# Altium footprint library 3D_MIG_Controller.PCBLIB: 560 footprints (part 32 of 35)
Each footprint in its own frame and in the unit in brackets; x right, y up, seen from the top. Pads: shape width x height; smd on the part's side, far side on the other; paste and mask are expansions set on the pad; w line width, h text height; cw(c..) or ccw(c..) is an arc to the next point about the centre after c.
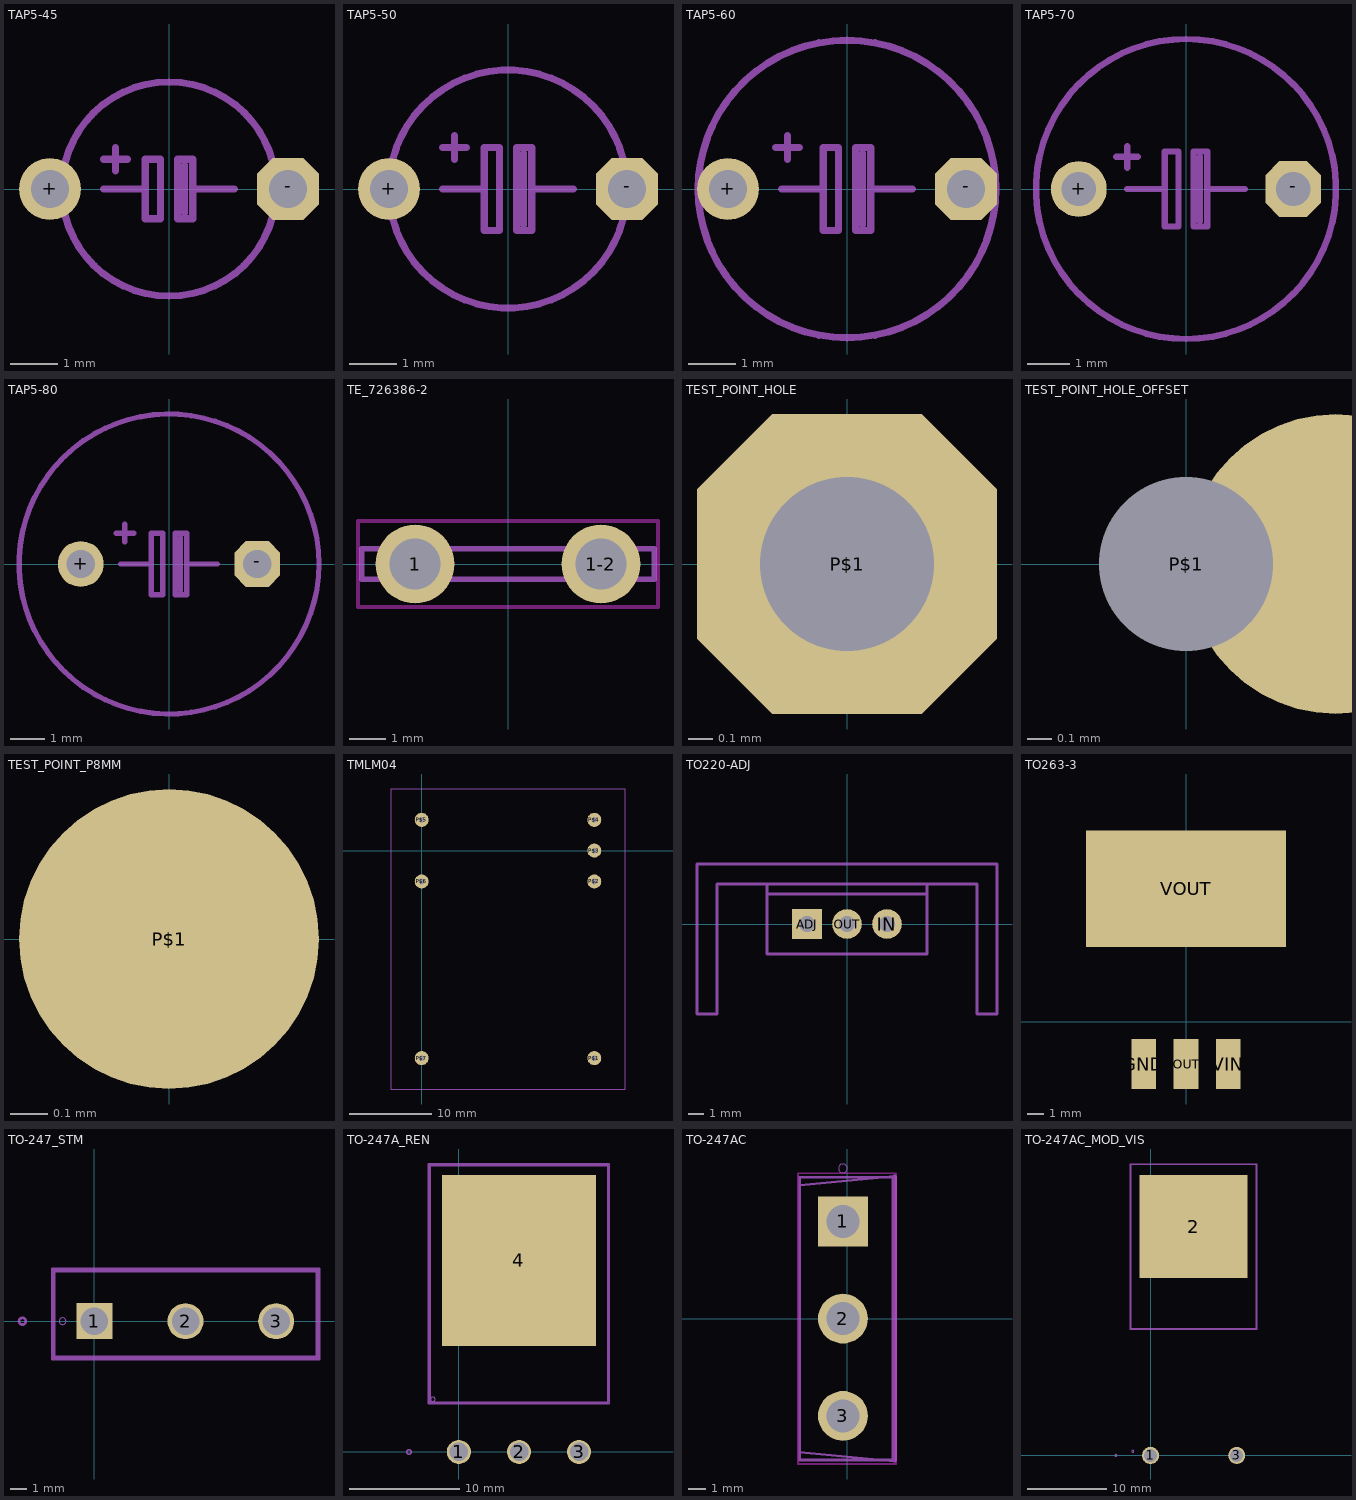
[diagram p31: the footprints below, top view; thin cyan lines are the x and y axes]

## TAP5-45 [mil]
pads (2):
  round 52 hole 32: +(-100,0)
  oct 52x52 / inner round 48.04 / far side oct 52x52 hole 32: -(100,0)
tDocu:
  lines w6: -75.37,-49.18 cw(c0,0) -75.37,49.18 ; 75.37,-49.18 ccw(c0,0) 75.37,49.18
tPlace:
  lines w6: -75.37,-49.18 ccw(c0,0) 75.37,-49.18 ; -75.37,49.18 cw(c0,0) 75.37,49.18 ; -55,0 -20,0 ; -55,25 -35,25 ; -45,15 -45,35 ; 13,-20 13,20 ; 55,0 20,0 ; -20,0 -20,-25 -7,-25 -7,25 -20,25 -20,0 ; 20,0 20,-25 7,-25 7,25 20,25 20,0
  text "TT" at -35,-75 h62

## TAP5-50 [mil]
pads (2):
  round 52 hole 32: +(-100,0)
  oct 52x52 / inner round 48.04 / far side oct 52x52 hole 32: -(100,0)
tDocu:
  lines w6: -84.87,-52.88 cw(c0,0) -84.87,52.88 ; 84.87,-52.88 ccw(c0,0) 84.87,52.88
tPlace:
  lines w6: -84.87,-52.88 ccw(c0,0) 84.87,-52.88 ; -84.87,52.88 cw(c0,0) 84.87,52.88 ; -55,0 -20,0 ; -55,35 -35,35 ; -45,25 -45,45 ; 13,-30 13,30 ; 55,0 20,0 ; -20,0 -20,-35 -7,-35 -7,35 -20,35 -20,0 ; 20,0 20,-35 7,-35 7,35 20,35 20,0
  text "TT" at -35,-85 h62

## TAP5-60 [mil]
pads (2):
  round 52 hole 32: +(-100,0)
  oct 52x52 / inner round 48.04 / far side oct 52x52 hole 32: -(100,0)
tDocu:
  lines w6: -113,-53.44 cw(c0,0) -113,53.44 ; 113,-53.44 ccw(c0,0) 113,53.44
tPlace:
  lines w6: -113,-53.44 ccw(c0,0) 113,-53.44 ; -113,53.44 cw(c0,0) 113,53.44 ; -60,35 -40,35 ; -55,0 -20,0 ; -50,25 -50,45 ; 13,-30 13,30 ; 55,0 20,0 ; -20,0 -20,-35 -7,-35 -7,35 -20,35 -20,0 ; 20,0 20,-35 7,-35 7,35 20,35 20,0
  text "TT" at 0,-100 h62

## TAP5-70 [mil]
pads (2):
  round 52 hole 32: +(-100,0)
  oct 52x52 / inner round 48.04 / far side oct 52x52 hole 32: -(100,0)
tDocu:
  lines w6: -132.87,-44.09 cw(c0,0) -132.87,44.09 ; 132.87,-44.09 ccw(c0,0) 132.87,44.09
tPlace:
  lines w6: -132.87,-44.09 ccw(c0,0) 132.87,-44.09 ; -132.87,44.09 cw(c0,0) 132.87,44.09 ; -65,30 -45,30 ; -55,0 -20,0 ; -55,20 -55,40 ; 13,-30 13,30 ; 55,0 20,0 ; -20,0 -20,-35 -7,-35 -7,35 -20,35 -20,0 ; 20,0 20,-35 7,-35 7,35 20,35 20,0
  text "TT" at 25,-95 h62

## TAP5-80 [mil]
pads (2):
  round 52 hole 32: +(-100,0)
  oct 52x52 / inner round 48.04 / far side oct 52x52 hole 32: -(100,0)
tPlace:
  circle w6: c0,0 r170
  lines w6: -60,35 -40,35 ; -55,0 -20,0 ; -50,25 -50,45 ; 13,-30 13,30 ; 55,0 20,0 ; -20,0 -20,-35 -7,-35 -7,35 -20,35 -20,0 ; 20,0 20,-35 7,-35 7,35 20,35 20,0
  text "TT" at 80,40 h62

## TE_726386-2 [mil]
pads (2):
  round 84.65 hole 55.12: 1(-100,0) 1-2(100,0)
Top keep-out:
  lines w3.94: -161.42,-46.26 -161.42,46.26 161.42,46.26 161.42,-46.26 -161.42,-46.26
tDocu:
  lines w5.91: -157.48,-16.34 -157.48,16.34 157.48,16.34 157.48,-16.34 -157.48,-16.34
tPlace:
  lines w5.91: -31.1,-16.34 31.1,-16.34 ; -31.1,16.34 31.1,16.34

## TEST_POINT_HOLE [mil]
pads (1):
  oct 47.56x47.56 / inner round 43.94 / far side oct 47.56x47.56 hole 27.56: P$1(0,0)

## TEST_POINT_HOLE_OFFSET [mil]
pads (1):
  round 47.56 hole 27.56 copper offset 23.78,0: P$1(0,0)

## TEST_POINT_P8MM [mil]
pads (1):
  rrect100% 31.5x31.5 smd: P$1(0,0)

## TMLM04 [mil]
pads (7):
  round 66.93 hole 27.56: P$1(826.77,-994.09) P$2(826.77,-147.64) P$3(826.77,0) P$4(826.77,147.64) P$5(0,147.64) P$6(0,-147.64) P$7(0,-994.09)
tPlace:
  lines w3.94: -147.64,-1141.73 974.41,-1141.73 974.41,295.28 -147.64,295.28 -147.64,-1141.73

## TO220-ADJ [mil]
pads (3):
  rect 74x74 / inner round 68.37 / far side rect 74x74 hole 39.37: ADJ(-100,0)
  round 74 hole 39.37: IN(100,0) OUT(0,0)
tDocu:
  lines w8: -200,100 -325,100 -325,-225 -375,-225 -375,150 375,150 375,-225 325,-225 325,100 200,100
tPlace:
  lines w8: -200,75 -200,-75 200,-75 200,75 ; -200,75 -200,100 200,100 200,75 ; -200,75 200,75

## TO263-3 [mm]
pads (4):
  rect 1.5x3 smd: GND(-2.54,-2.54) VIN(2.54,-2.54) VOUT1(0,-2.54)
  rect 12x7 smd: VOUT(0,8)

## TO-247_STM [mil]
pads (3):
  rect 85x85 / inner round 78.53 / far side rect 85x85 hole 65: 1(0,0)
  round 85 hole 65: 2(215,0) 3(429,0)
tDocu:
  lines w0: -83,0 ccw(c-75,0) -67,0 ccw(c-75,0) -83,0
  lines w6: -10,0 10,0 ; 0,-10 0,10 ; -95,-84 525,-84 525,118 -95,118 -95,-84
tPlace:
  lines w6: -178,0 ccw(c-170,0) -162,0 ccw(c-170,0) -178,0 ; -100,-90 530,-90 530,124 -100,124 -100,-90

## TO-247A_REN [mil]
pads (4):
  round 86 hole 66: 1(0,0) 2(215,0) 3(429,0)
  rect 551x610 smd: 4(214.57,684)
tDocu:
  lines w0: -101,188 ccw(c-93,188) -85,188 ccw(c-93,188) -101,188
  lines w6: -10,0 10,0 ; 0,-10 0,10 ; -103,178 532,178 532,1022 -103,1022 -103,178
tPlace:
  lines w6: -186,0 ccw(c-178,0) -170,0 ccw(c-178,0) -186,0 ; -108,172 537,172 537,1028 -108,1028 -108,172

## TO-247AC [mm]
pads (3):
  rect 2.8x2.8 / inner round 2.587 / far side rect 2.8x2.8 hole 1.85: 1(-0.227,5.46)
  round 2.8 hole 1.85: 2(-0.227,0) 3(-0.227,-5.46)
Top keep-out:
  lines w0.1: -2.755,-8.162 -2.755,8.162 2.755,8.162 2.755,-8.162 -2.755,-8.162
tDocu:
  lines w0.15: -2.655,-7.935 -2.655,7.935 2.655,7.935 2.655,-7.935 -2.655,-7.935
tPlace:
  circle w0: c-0.227,8.435 r0.25
  lines w0.15: 2.655,-8 -2.655,-7.5 -2.655,7.5 2.655,8
  lines w0.3: 2.655,-7.935 2.655,7.935

## TO-247AC_MOD_VIS [mil]
pads (3):
  round 85 hole 65: 1(0,0) 3(430,0)
  rect 540x515 smd: 2(214.96,1142)
tDocu:
  lines w0: -93,20 ccw(c-88,20) -83,20 ccw(c-88,20) -93,20
  lines w6: -98,634 527,634 527,1450 -98,1450 -98,634
tPlace:
  lines w6: -178,0 ccw(c-173,0) -168,0 ccw(c-173,0) -178,0 ; -103,630 532,630 532,1454 -103,1454 -103,630